# Altium footprint library Connecteurs_Wurth.PcbLib: 33 footprints (part 1 of 3)
Each footprint in its own frame and in the unit in brackets; x right, y up, seen from the top. Pads: shape width x height; smd on the part's side, far side on the other; paste and mask are expansions set on the pad; w line width, h text height; cw(c..) or ccw(c..) is an arc to the next point about the centre after c.
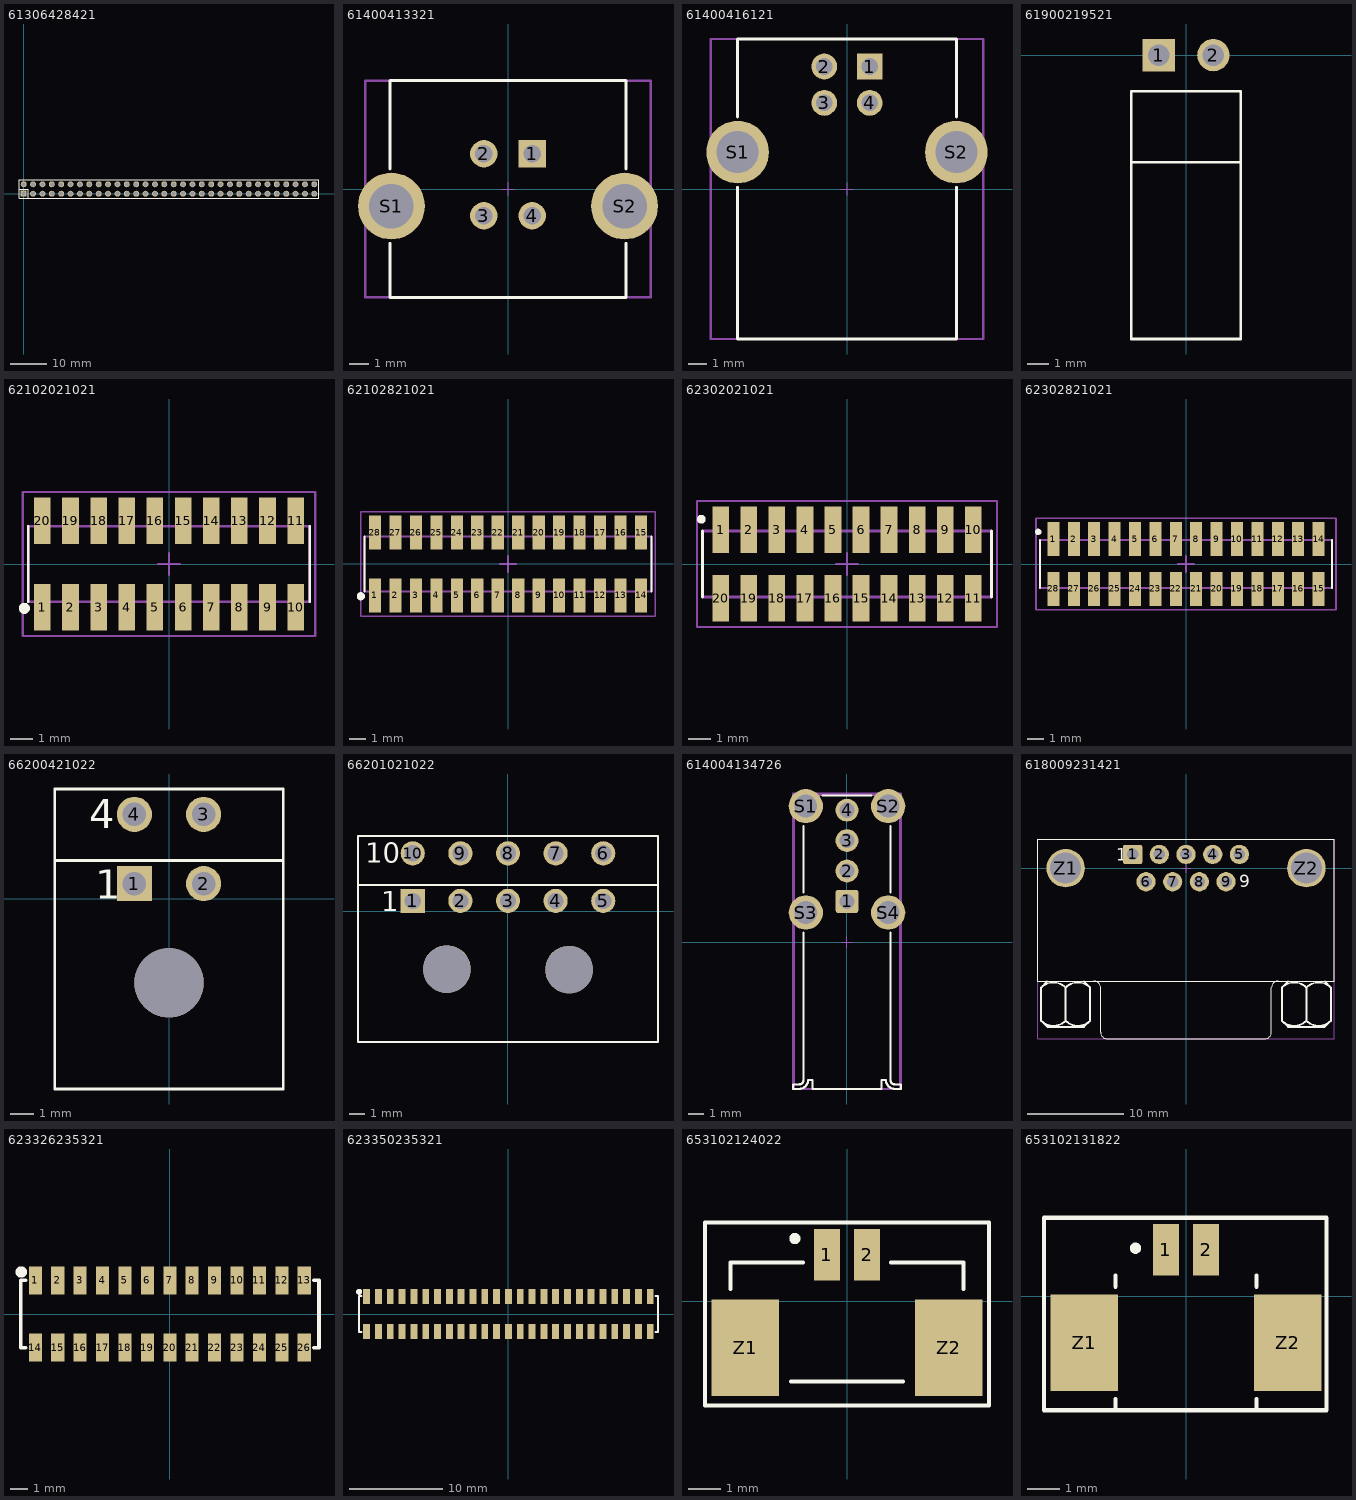
[diagram p0: the footprints below, top view; thin cyan lines are the x and y axes]

## 61306428421 [mm] "64 pins, dual row, gold plating"
height 21.24
pads (64):
  rect 1.6x1.6 hole 1.1: 1(0,0)
  round 1.6 hole 1.1: 2(2.54,0) 3(5.08,0) 4(7.62,0) 5(10.16,0) 6(12.7,0) 7(15.24,0) 8(17.78,0) 9(20.32,0) 10(22.86,0) 11(25.4,0) 12(27.94,0) 13(30.48,0) 14(33.02,0) 15(35.56,0) 16(38.1,0) 17(40.64,0) 18(43.18,0) 19(45.72,0) 20(48.26,0) 21(50.8,0) 22(53.34,0) 23(55.88,0) 24(58.42,0) 25(60.96,0) 26(63.5,0) 27(66.04,0) 28(68.58,0) 29(71.12,0) 30(73.66,0) 31(76.2,0) 32(78.74,0) 33(78.74,2.54) 34(76.2,2.54) 35(73.66,2.54) 36(71.12,2.54) 37(68.58,2.54) 38(66.04,2.54) 39(63.5,2.54) 40(60.96,2.54) 41(58.42,2.54) 42(55.88,2.54) 43(53.34,2.54) 44(50.8,2.54) 45(48.26,2.54) 46(45.72,2.54) 47(43.18,2.54) 48(40.64,2.54) 49(38.1,2.54) 50(35.56,2.54) 51(33.02,2.54) 52(30.48,2.54) 53(27.94,2.54) 54(25.4,2.54) 55(22.86,2.54) 56(20.32,2.54) 57(17.78,2.54) 58(15.24,2.54) 59(12.7,2.54) 60(10.16,2.54) 61(7.62,2.54) 62(5.08,2.54) 63(2.54,2.54) 64(0,2.54)
Top Overlay:
  lines w0.2: -1.27,1.27 1.27,1.27 1.27,-1.27 ; -1.27,-1.27 -1.27,3.81 3.81,3.81 80.01,3.81 80.01,-1.27 -1.27,-1.27
Mechanical 13:
  text ".Designator" at 34.29,0.889 h2
3D body "61306428421.stp": height 21.25, standoff -2.99, extent -1.27,-1.27 80.01,3.81

## 61400413321 [mm] "USB 2.0 Type B Vertical"
height 16.1
pads (6):
  rect 1.42x1.42 hole 0.92: 1(1.25,1.82)
  round 1.42 hole 0.92: 2(-1.25,1.82) 3(-1.25,-1.38) 4(1.25,-1.38)
  round 3.45 hole 2.3: S1(-6.02,-0.88) S2(6.02,-0.88)
Top Overlay:
  lines w0.15: -6.1,-2.8 -6.1,-5.6 6.1,-5.6 6.1,-2.8 ; -6.1,1.04 -6.1,5.6 6.1,5.6 6.1,1.04
Mechanical 13:
  lines w0.1: -7.35,-5.6 -7.35,5.6 7.35,5.6 7.35,-5.6 -7.35,-5.6
  text ".Designator" at -5.207,-0.254 h2
Mechanical 15:
  lines w0.05: -0.35,0 0.35,0 ; 0,-0.35 0,0.35
  lines w0.127: -7.366,-5.588 -7.366,5.588 7.366,5.588 7.366,-5.588 -7.366,-5.588
3D body "61400413321.stp": height 16.15, standoff -4.17, extent -7.35,-5.6 7.35,5.6

## 61400416121 [mm] "USB 2.0 Type B Horizontal"
height 11.05
pads (6):
  rect 1.42x1.42 hole 0.92: 1(1.25,6.74)
  round 1.42 hole 0.92: 2(-1.25,6.74) 3(-1.25,4.74) 4(1.25,4.74)
  round 3.45 hole 2.3: S1(-6.02,2.03) S2(6.02,2.03)
Top Overlay:
  lines w0.15: -6.02,0.1 -6.02,-8.25 6.02,-8.25 6.02,0.1 ; -6.02,3.96 -6.02,8.25 6.02,8.25 6.02,3.96
Mechanical 13:
  lines w0.1: -7.47,-8.25 7.47,-8.25 7.47,8.25 -7.47,8.25 -7.47,-8.25
  text ".Designator" at -5.207,-0.762 h2
Mechanical 15:
  lines w0.05: -0.35,0 0.35,0 ; 0,-0.35 0,0.35
  lines w0.127: -7.493,-8.255 7.493,-8.255 7.493,8.255 -7.493,8.255 -7.493,-8.255
3D body "61400416121.stp": height 11.1, standoff -3.76, extent -7.484,-8.25 7.484,8.25

## 61900219521 [mm] "M RA 2p 1 row left"
height 5.8
pads (2):
  rect 1.5x1.5 hole 1: 1(-1.27,0)
  round 1.5 hole 1: 2(1.27,0)
Top Overlay:
  lines w0.127: -2.54,-13.1 -2.54,-1.67 2.54,-1.67 2.54,-12.95 ; -2.54,-13.17 -2.54,-4.97 2.54,-4.97 2.54,-13.17 -2.54,-13.17
Mechanical 13:
  text ".Designator" at -4.953,-2.667 h2
3D body "61900219521.stp": height 5.81, standoff -2.39, extent -2.54,-13.17 2.54,0.35

## 62102021021 [mm] "20 pins, dual row, straight, gold plating"
height 5.9
pads (20):
  rect 0.75x2.1 smd: 1(-5.715,-1.95) 2(-4.445,-1.95) 3(-3.175,-1.95) 4(-1.905,-1.95) 5(-0.635,-1.95) 6(0.635,-1.95) 7(1.905,-1.95) 8(3.175,-1.95) 9(4.445,-1.95) 10(5.715,-1.95) 11(5.715,1.95) 12(4.445,1.95) 13(3.175,1.95) 14(1.905,1.95) 15(0.635,1.95) 16(-0.635,1.95) 17(-1.905,1.95) 18(-3.175,1.95) 19(-4.445,1.95) 20(-5.715,1.95)
Top Overlay:
  circle w0.25: c-6.525,-2 r0.125
  lines w0.127: -6.35,-1.7 -6.35,1.7 ; 6.35,-1.7 6.35,1.7
Mechanical 13:
  lines w0.127: -6.35,-1.7 -6.35,1.7 6.35,1.7 6.35,-1.7 -6.35,-1.7
  text ".Designator" at -5.08,-0.381 h2
Mechanical 15:
  lines w0.1: -0.5,0 0.5,0 ; 0,-0.5 0,0.5 ; -6.6,-3.25 -6.6,3.25 6.6,3.25 6.6,-3.25 -6.6,-3.25
3D body "62102021021.stp": height 5.88, standoff -0.02, extent -6.35,-2.55 6.35,2.55

## 62102821021 [mm] "28 pins, dual row, straight, gold plating"
height 5.9
pads (28):
  rect 0.75x2.1 smd: 1(-8.255,-1.95) 2(-6.985,-1.95) 3(-5.715,-1.95) 4(-4.445,-1.95) 5(-3.175,-1.95) 6(-1.905,-1.95) 7(-0.635,-1.95) 8(0.635,-1.95) 9(1.905,-1.95) 10(3.175,-1.95) 11(4.445,-1.95) 12(5.715,-1.95) 13(6.985,-1.95) 14(8.255,-1.95) 15(8.255,1.95) 16(6.985,1.95) 17(5.715,1.95) 18(4.445,1.95) 19(3.175,1.95) 20(1.905,1.95) 21(0.635,1.95) 22(-0.635,1.95) 23(-1.905,1.95) 24(-3.175,1.95) 25(-4.445,1.95) 26(-5.715,1.95) 27(-6.985,1.95) 28(-8.255,1.95)
Top Overlay:
  circle w0.25: c-9.125,-2 r0.125
  lines w0.127: -8.89,-1.7 -8.89,1.7 ; 8.89,-1.7 8.89,1.7
Mechanical 13:
  lines w0.127: -8.89,-1.7 8.89,-1.7 8.89,1.7 -8.89,1.7 -8.89,-1.7
  text ".Designator" at -5.334,-0.381 h2
Mechanical 15:
  lines w0.1: -0.5,0 0.5,0 ; 0,-0.5 0,0.5 ; -9.14,-3.25 9.14,-3.25 9.14,3.25 -9.14,3.25 -9.14,-3.25
3D body "62102821021.stp": height 5.88, standoff -0.02, extent -8.89,-2.55 8.89,2.55

## 62302021021 [mm] "20 pins, dual row, straight, gold plating"
height 4.5
pads (20):
  rect 0.75x2.1 smd: 1(-5.715,1.55) 2(-4.445,1.55) 3(-3.175,1.55) 4(-1.905,1.55) 5(-0.635,1.55) 6(0.635,1.55) 7(1.905,1.55) 8(3.175,1.55) 9(4.445,1.55) 10(5.715,1.55) 11(5.715,-1.55) 12(4.445,-1.55) 13(3.175,-1.55) 14(1.905,-1.55) 15(0.635,-1.55) 16(-0.635,-1.55) 17(-1.905,-1.55) 18(-3.175,-1.55) 19(-4.445,-1.55) 20(-5.715,-1.55)
Top Overlay:
  circle w0.2: c-6.604,2.032 r0.1
  lines w0.127: -6.55,-1.5 -6.55,1.5 ; 6.55,-1.5 6.55,1.5
Mechanical 13:
  lines w0.127: -6.55,-1.5 -6.55,1.5 6.55,1.5 6.55,-1.5 -6.55,-1.5
  text ".Designator" at -5.207,-0.508 h2
Mechanical 15:
  lines w0.1: -0.5,0 0.5,0 ; 0,-0.5 0,0.5 ; -6.8,-2.85 -6.8,2.85 6.8,2.85 6.8,-2.85 -6.8,-2.85
3D body "62302021021.stp": height 4.65, standoff -0.05, extent -6.55,-2.4 6.55,2.4

## 62302821021 [mm] "28 pins, dual row, straight, gold plating"
height 4.5
pads (28):
  rect 0.75x2.1 smd: 1(-8.255,1.55) 2(-6.985,1.55) 3(-5.715,1.55) 4(-4.445,1.55) 5(-3.175,1.55) 6(-1.905,1.55) 7(-0.635,1.55) 8(0.635,1.55) 9(1.905,1.55) 10(3.175,1.55) 11(4.445,1.55) 12(5.715,1.55) 13(6.985,1.55) 14(8.255,1.55) 15(8.255,-1.55) 16(6.985,-1.55) 17(5.715,-1.55) 18(4.445,-1.55) 19(3.175,-1.55) 20(1.905,-1.55) 21(0.635,-1.55) 22(-0.635,-1.55) 23(-1.905,-1.55) 24(-3.175,-1.55) 25(-4.445,-1.55) 26(-5.715,-1.55) 27(-6.985,-1.55) 28(-8.255,-1.55)
Top Overlay:
  circle w0.2: c-9.2,2 r0.1
  lines w0.127: -9.09,-1.5 -9.09,1.5 ; 9.09,-1.5 9.09,1.5
Mechanical 13:
  lines w0.127: -9.09,-1.5 -9.09,1.5 9.09,1.5 9.09,-1.5 -9.09,-1.5
  text ".Designator" at -4.953,-0.508 h2
Mechanical 15:
  lines w0.1: -0.5,0 0.5,0 ; 0,-0.5 0,0.5 ; -9.34,-2.85 -9.34,2.85 9.34,2.85 9.34,-2.85 -9.34,-2.85
3D body "62302821021.stp": height 4.65, standoff -0.05, extent -9.09,-2.4 9.09,2.4

## 66200421022 [mm] "Dual row Right angle header With plastic peg 04p"
height 8.76
pads (5):
  rect 1.52x1.52 hole 1.02: 1(-1.5,0.65)
  round 1.52 hole 1.02: 2(1.5,0.65) 3(1.5,3.65) 4(-1.5,3.65)
  round 3 hole 3 unplated: ""(0,-3.65)
Top Overlay:
  lines w0.127: -4.95,-8.25 4.95,-8.25 ; -4.95,-8.25 -4.95,1.65 4.95,1.65 4.95,-8.25 ; -4.95,-8.25 4.95,-8.25 ; -4.95,-8.25 -4.95,4.75 4.95,4.75 4.95,-8.25
  text "1" at -3.2,0 h1.27
  text "4" at -3.453,3.039 h1.27
Mechanical 13:
  text ".Designator" at -4.953,-1.524 h2
3D body "66200421022.stp": height 8.78, standoff -3.18, extent -4.85,-8.25 4.85,3.97

## 66201021022 [mm] "Dual row Right angle header With plastic peg 10p"
height 8.76
pads (12):
  rect 1.52x1.52 hole 1.02: 1(-6,0.665)
  round 1.52 hole 1.02: 2(-3,0.665) 3(0,0.665) 4(3,0.665) 5(6,0.665) 6(6,3.665) 7(3,3.665) 8(0,3.665) 9(-3,3.665) 10(-6,3.665)
  round 3 hole 3 unplated: ""(-3.85,-3.635) ""(3.85,-3.665)
Top Overlay:
  lines w0.127: -9.45,-8.235 9.45,-8.235 ; -9.45,-8.235 -9.45,1.665 9.45,1.665 9.45,-8.235 ; -9.45,-8.235 9.45,-8.235 ; -9.45,-8.235 -9.45,4.765 9.45,4.765 9.45,-8.235
  text "1" at -8,0 h1.27
  text "10" at -8.986,3.054 h1.27
Mechanical 13:
  text ".Designator" at -5.08,-1.651 h2
3D body "66201021022.stp": height 8.78, standoff -3.18, extent -9.35,-8.235 9.35,3.985

## 614004134726 [mm] "USB 2.0 Type A Up Right"
height 14.5
pads (8):
  rrect20% 1.5x1.5 hole 1: 1(0,2.68)
  round 1.5 hole 1: 2(0,4.68) 3(0,6.68) 4(0,8.68)
  round 2.25 hole 1.5: S1(-2.71,8.95) S2(2.71,8.95) S3(-2.71,1.95) S4(2.71,1.95)
Top Overlay:
  lines w0.15: -2.86,0.63 -2.86,-9.06 cw(c-3.15,-9.06) -3.15,-9.35 -3.55,-9.35 -3.55,-9.65 -3.15,-9.65 ccw(c-3.15,-9.06) -2.56,-9.06 -2.27,-9.06 -2.27,-9.65 2.27,-9.65 2.27,-9.06 2.56,-9.06 ccw(c3.15,-9.06) 3.15,-9.65 3.55,-9.65 3.55,-9.35 3.15,-9.35 cw(c3.15,-9.06) 2.86,-9.06 2.86,0.63 ; -2.86,3.27 -2.86,7.64 ; -1.59,9.65 1.59,9.65 ; 2.86,3.27 2.86,7.64
Mechanical 13:
  lines w0.1: -3.475,-9.65 -3.475,9.65 3.475,9.65 3.475,-9.65 -3.475,-9.65
  text ".Designator" at -4.953,-2.667 h2
Mechanical 15:
  lines w0.05: -0.35,0 0.35,0 ; 0,-0.35 0,0.35
  lines w0.127: -3.556,-9.652 3.556,-9.652 3.556,9.779 -3.556,9.779 -3.556,-9.652
3D body "614004134726.stp": height 14.51, standoff -3.8, extent -3.55,-9.65 3.55,9.65

## 618009231421 [mm] "9 pins, right angled, 10.3mm, with hex screw"
height 12.5
pads (11):
  rrect20% 2x2 hole 1.2: 1(-5.54,1.42)
  round 2 hole 1.2: 2(-2.77,1.42) 3(0,1.42) 4(2.77,1.42) 5(5.54,1.42) 6(-4.155,-1.42) 7(-1.385,-1.42) 8(1.385,-1.42) 9(4.155,-1.42)
  round 4 hole 3.2: Z1(-12.5,0) Z2(12.5,0)
Top Overlay:
  lines w0.127: -9.56,-11.725 cw(c-9.56,-12.42) -8.865,-12.42 -8.865,-17.02 ; -8.86,-17.025 ccw(c-8.165,-17.025) -8.165,-17.72 8.165,-17.72 ccw(c8.165,-17.025) 8.86,-17.025 ; 8.865,-17.02 8.865,-12.42 cw(c9.56,-12.42) 9.56,-11.725 ; -15.4,-11.72 -15.4,3 15.4,3 15.4,-11.72 -15.4,-11.72
  lines w0.2: -15.042,-15.855 -14.407,-16.49 -10.597,-16.49 -9.962,-15.855 -9.962,-12.399 -10.597,-11.764 ; -15.042,-15.84 -15.042,-12.399 -14.407,-11.764 ; -15.042,-14.788 -15.042,-14.576 ; -12.502,-15.84 -12.502,-12.399 ; 9.958,-15.855 10.593,-16.49 14.403,-16.49 15.038,-15.855 15.038,-12.399 14.403,-11.764 ; 9.958,-15.84 9.958,-12.399 10.593,-11.764 ; 9.958,-14.788 9.958,-14.576 ; 12.498,-15.84 12.498,-12.399
  lines w0.203: -15.044,-12.397 cw(c-13.772,-13.669) -12.5,-12.397 ; -15.042,-15.84 ccw(c-13.77,-14.568) -12.498,-15.84 ; -12.507,-15.84 ccw(c-11.234,-14.568) -9.962,-15.84 ; -12.504,-12.397 cw(c-11.232,-13.669) -9.96,-12.397 ; 9.956,-12.397 cw(c11.228,-13.669) 12.5,-12.397 ; 9.958,-15.84 ccw(c11.23,-14.568) 12.502,-15.84 ; 12.493,-15.84 ccw(c13.766,-14.568) 15.038,-15.84 ; 12.496,-12.397 cw(c13.768,-13.669) 15.04,-12.397
  text "1" at -7.25,0.75 h1.27
  text "9" at 5.5,-2 h1.27
Mechanical 13:
  lines w0.127: -15.4,-17.72 15.4,-17.72 15.4,3 -15.4,3 -15.4,-17.72
  text ".Designator" at -5.08,-4.064 h2
Mechanical 15:
  lines w0.1: -0.5,0 0.5,0 ; 0,-0.5 0,0.5
  lines w0.127: -15.4,-17.7 -15.4,3 15.4,3 15.4,-17.7 -15.4,-17.7
3D body "618009231421.stp": height 12.51, standoff -3.09, extent -15.409,-17.722 15.401,3.028

## 623326235321 [mm] "26 pins, dual row, straight, gold plating"
height 2.2
pads (26):
  rect 0.74x1.6 smd: 1(-7.62,1.9) 2(-6.35,1.9) 3(-5.08,1.9) 4(-3.81,1.9) 5(-2.54,1.9) 6(-1.27,1.9) 7(0,1.9) 8(1.27,1.9) 9(2.54,1.9) 10(3.81,1.9) 11(5.08,1.9) 12(6.35,1.9) 13(7.62,1.9) 14(-7.62,-1.9) 15(-6.35,-1.9) 16(-5.08,-1.9) 17(-3.81,-1.9) 18(-2.54,-1.9) 19(-1.27,-1.9) 20(0,-1.9) 21(1.27,-1.9) 22(2.54,-1.9) 23(3.81,-1.9) 24(5.08,-1.9) 25(6.35,-1.9) 26(7.62,-1.9)
Top Overlay:
  circle w0.4: c-8.42,2.38 r0.125
  lines w0.2: -8.155,-1.925 -8.455,-1.925 -8.455,1.925 -8.155,1.925 ; 8.155,-1.925 8.455,-1.925 8.455,1.925 8.155,1.925
Mechanical 13:
  text ".Designator" at -5.588,-0.381 h2
3D body "623326235321.stp": height 2.25, standoff 0, extent -8.455,-2.2 8.455,2.2

## 623350235321 [mm] "50 pins, dual row, straight, gold plating"
height 2.2
pads (50):
  rect 0.74x1.6 smd: 1(-15.24,1.9) 2(-13.97,1.9) 3(-12.7,1.9) 4(-11.43,1.9) 5(-10.16,1.9) 6(-8.89,1.9) 7(-7.62,1.9) 8(-6.35,1.9) 9(-5.08,1.9) 10(-3.81,1.9) 11(-2.54,1.9) 12(-1.27,1.9) 13(0,1.9) 14(1.27,1.9) 15(2.54,1.9) 16(3.81,1.9) 17(5.08,1.9) 18(6.35,1.9) 19(7.62,1.9) 20(8.89,1.9) 21(10.16,1.9) 22(11.43,1.9) 23(12.7,1.9) 24(13.97,1.9) 25(15.24,1.9) 26(-15.24,-1.9) 27(-13.97,-1.9) 28(-12.7,-1.9) 29(-11.43,-1.9) 30(-10.16,-1.9) 31(-8.89,-1.9) 32(-7.62,-1.9) 33(-6.35,-1.9) 34(-5.08,-1.9) 35(-3.81,-1.9) 36(-2.54,-1.9) 37(-1.27,-1.9) 38(0,-1.9) 39(1.27,-1.9) 40(2.54,-1.9) 41(3.81,-1.9) 42(5.08,-1.9) 43(6.35,-1.9) 44(7.62,-1.9) 45(8.89,-1.9) 46(10.16,-1.9) 47(11.43,-1.9) 48(12.7,-1.9) 49(13.97,-1.9) 50(15.24,-1.9)
Top Overlay:
  circle w0.4: c-16.04,2.38 r0.125
  lines w0.2: -15.775,-1.925 -16.075,-1.925 -16.075,1.925 -15.775,1.925 ; 15.775,-1.925 16.075,-1.925 16.075,1.925 15.775,1.925
Mechanical 13:
  text ".Designator" at -4.826,-0.254 h2
3D body "623350235321.stp": height 2.25, standoff 0, extent -16.075,-2.2 16.075,2.2

## 653102124022 [mm] "SMT Male Vertical Shrouded Header - 02p 1 row - T & R packaging"
height 4.75
pads (4):
  rect 0.81x1.6 smd: 1(-0.625,1.45) 2(0.625,1.45)
  rect 2.1x3 smd: Z1(-3.175,-1.45) Z2(3.175,-1.45)
Top Overlay:
  circle w0.2: c-1.625,1.95 r0.075
  lines w0.127: -3.625,0.375 -3.625,1.2 -1.375,1.2 ; -1.75,-2.5 1.75,-2.5 ; 1.375,1.2 3.625,1.2 3.625,0.375 ; -4.425,-3.25 -4.425,2.45 4.425,2.45 4.425,-3.25 -4.425,-3.25
Mechanical 13:
  text ".Designator" at -4.826,-1.397 h2
3D body "653102124022.stp": height 4.97, standoff -0.03, extent -3.625,-2.5 3.625,1.705

## 653102131822 [mm] "SMT Male Horizontal Shrouded Header - 02p 1 row - T & R packaging"
height 3.4
pads (4):
  rect 0.81x1.6 smd: 1(-0.625,1.45) 2(0.625,1.45)
  rect 2.1x3 smd: Z1(-3.175,-1.45) Z2(3.175,-1.45)
Top Overlay:
  circle w0.2: c-1.575,1.5 r0.075
  lines w0.127: -2.2,-3.55 -2.2,-3.2 ; -2.2,0.3 -2.2,0.65 ; 2.2,-3.55 2.2,-3.2 ; 2.2,0.3 2.2,0.65 ; -4.425,-3.55 4.375,-3.55 4.375,2.45 -4.425,2.45 -4.425,-3.55
Mechanical 13:
  text ".Designator" at -4.953,-2.667 h2
3D body "653102131822.stp": height 3.38, standoff -0.03, extent -3.625,-3.5 3.625,1.91